# Altium footprint library TarabusLib_KAP.PcbLib: 504 footprints (part 14 of 32)
Each footprint in its own frame and in the unit in brackets; x right, y up, seen from the top. Pads: shape width x height; smd on the part's side, far side on the other; paste and mask are expansions set on the pad; w line width, h text height; cw(c..) or ccw(c..) is an arc to the next point about the centre after c.
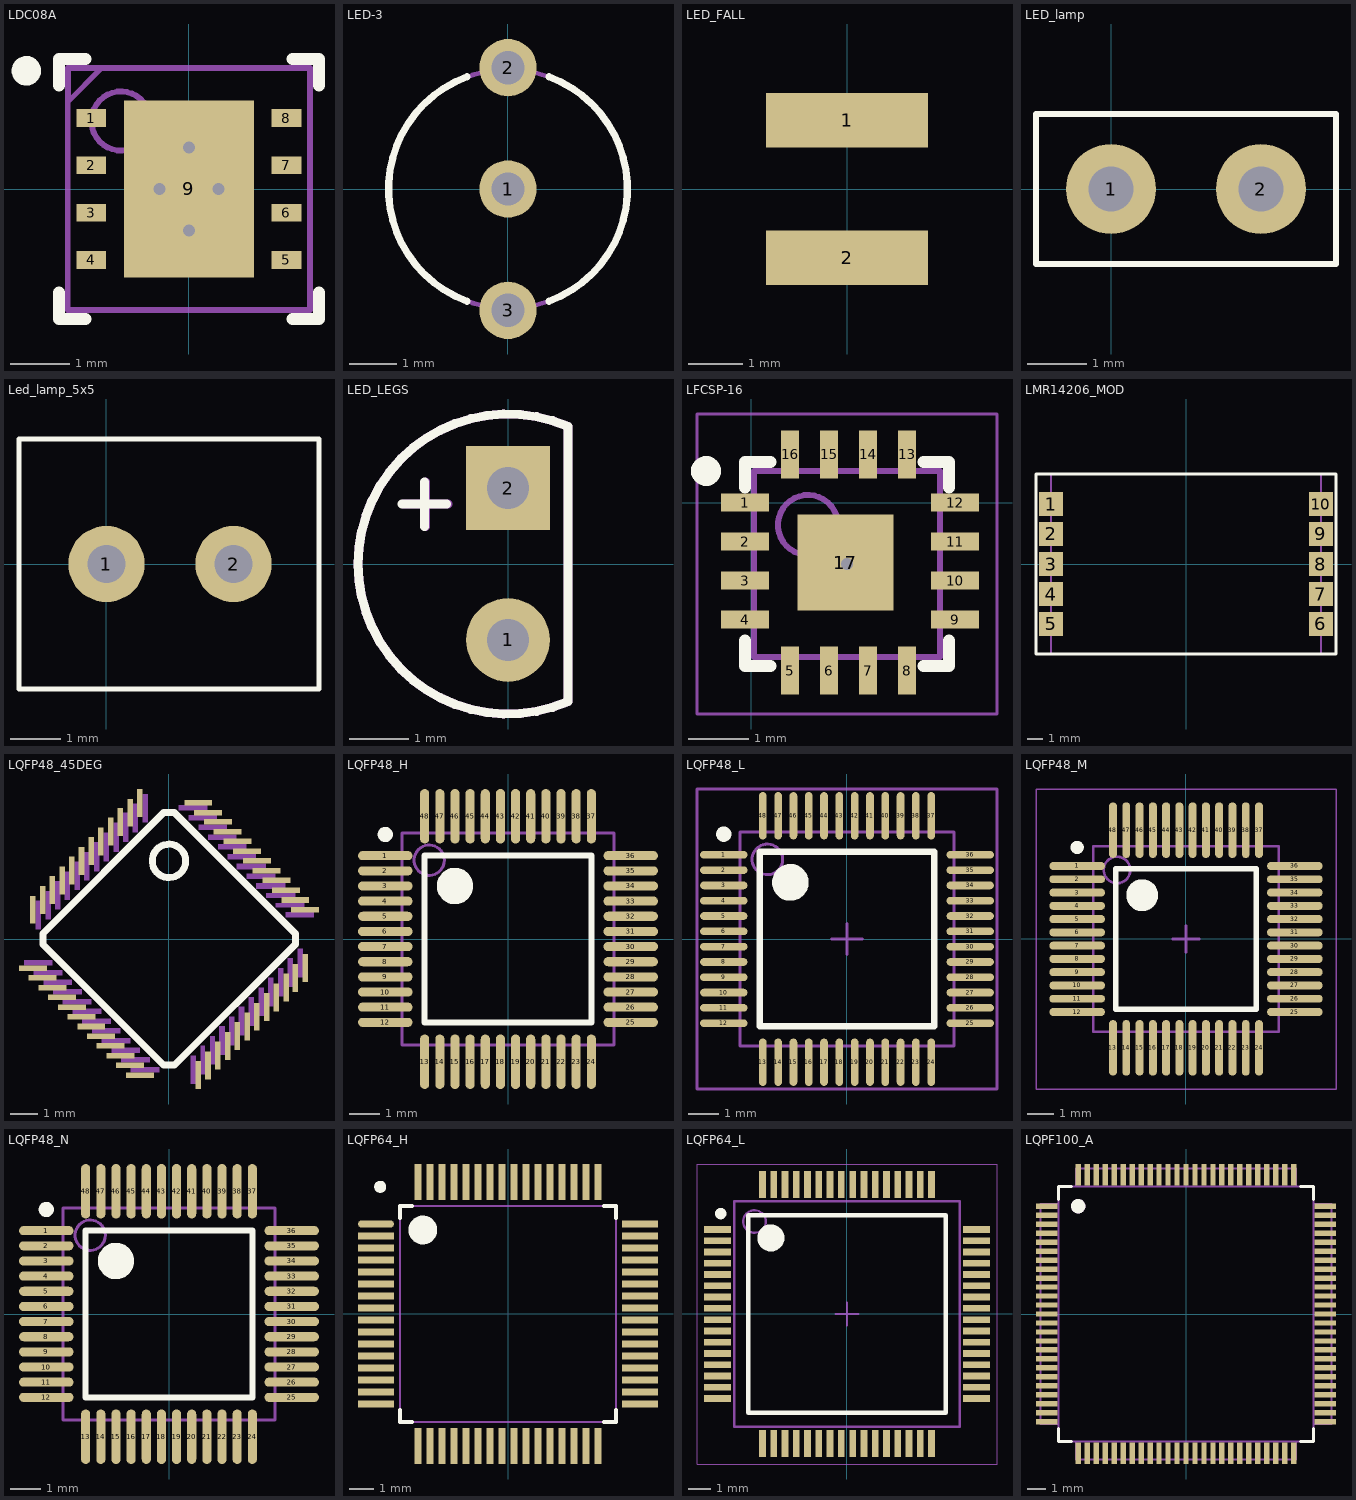
[diagram p13: the footprints below, top view; thin cyan lines are the x and y axes]

## LDC08A [mm] "PSON, 8-Leads, Body 4x4mm, Pitch 0.8mm, NSC Recommended"
height 0.8
pads (9):
  rect 0.5x0.3 smd mask+0.051: 1(-1.65,1.2) 2(-1.65,0.4) 3(-1.65,-0.4) 4(-1.65,-1.2) 5(1.65,-1.2) 6(1.65,-0.4) 7(1.65,0.4) 8(1.65,1.2)
  rect 2.2x3 smd paste-1.5 mask+0.051: 9(0,0)
via 0,-0.7 diameter 0.5 hole 0.2
via 0,0.7 diameter 0.5 hole 0.2
via 0.5,0 diameter 0.5 hole 0.2
via -0.5,0 diameter 0.5 hole 0.2
Top Overlay:
  circle w0.25: c-2.75,2 r0.125
  lines w0.2: -2.2,-1.75 -2.2,-2.2 -1.75,-2.2 ; -2.2,1.75 -2.2,2.2 -1.75,2.2 ; 1.75,-2.2 2.2,-2.2 2.2,-1.75 ; 1.75,2.2 2.2,2.2 2.2,1.75
Top Paste:
  region: 1,-0.15 0.15,-0.15 0.15,-1.4 1,-1.4
  rectangle: -1,-1.4 -0.15,-0.15
  rectangle: -1,0.15 -0.15,1.4
  region: 1,1.4 0.15,1.4 0.15,0.15 1,0.15
Mechanical 7:
  lines w0.05: -2.05,1.45 -1.45,2.05 ; -2.05,2.029 -1.494,2.029 ; -2.037,1.513 -1.525,2.025 ; -2.021,1.494 -2.021,2.05 ; -2.05,-2.05 -2.05,2.057 2.05,2.057 2.05,-2.05 -2.05,-2.05
  lines w0.1: -0.5,0 0.5,0 ; 0,-0.5 0,0.5
Mechanical 9:
  circle w0.1: c-1.15,1.15 r0.5
  lines w0.1: -2.05,-2.05 -2.05,2.05 2.05,2.05 2.05,-2.05 -2.05,-2.05
Mechanical 10:
  text ".Designator" at -0.9,-2.8 h0.6
  text ".Comment" at -0.9,2.5 h0.6
3D body: height 0.8, standoff 0, extent -2.05,-2.05 2.05,2.05

## LED-3 [mm]
pads (3):
  round 1.2 hole 0.7: 1(0,0) 2(0,2.54) 3(0,-2.54)
Top Overlay:
  lines w0.15: -0.855,-2.349 cw(c0,0) -0.855,2.349 ; 0.855,-2.349 ccw(c0,0) 0.855,2.349
Mechanical 7:
  circle w0.1: c0,0 r2.5
Mechanical 10:
  text ".Comment" at -0.5,-3.875 h0.6
  text ".Designator" at -0.625,3.575 h0.8

## LED_FALL [mm]
pads (2):
  rect 3x1 smd: 1(0,1.27) 2(0,-1.27)

## LED_lamp [mil] "Rectangular Type LED lamp"
pads (2):
  round 60 hole 30: 1(0,0) 2(100,0)
Top Overlay:
  lines w3.94: -50,-50 -50,50 150,50 150,-50 -50,-50
3D body "Rectangular Type LED lamp (зеленый).STEP": height 275.59, standoff -1000, extent -49.21,-53.15 147.64,53.15

## Led_lamp_5x5 [mil]
pads (2):
  round 60 hole 30: 1(0,0) 2(100,0)
Top Overlay:
  lines w3.94: -59.06,98.43 157.48,98.43 ; 167.32,78.74 167.32,-78.74 ; 157.48,98.43 -68.9,98.43 -68.9,78.74 -68.9,0 -68.9,-78.74 -68.9,-98.43 -59.06,-98.43 157.48,-98.43 167.32,-98.43 167.32,-78.74 ; 157.48,98.43 167.32,98.43 167.32,-78.74
3D body "5x5mm SQUARE TOP LED LAMP (красный).STEP": height 283.46, standoff -1062.99, extent -68.9,-98.43 167.32,98.43

## LED_LEGS [mm]
height 7.6
pads (2):
  round 1.4 hole 0.7: 1(0,-1.27)
  rect 1.4x1.4 hole 0.7: 2(0,1.27)
Top Overlay:
  lines w0.15: -1.775,1 -1.025,1 ; -1.4,0.625 -1.4,1.375 ; 1,-2.3 cw(c0,0) 1,2.3 1,-2.3
Mechanical 7:
  lines w0.15: -1.75,1 -1,1 ; -1.375,0.625 -1.375,1.375 ; 1,-2.3 cw(c0,0) 1,2.3 1,-2.3
Mechanical 10:
  text ".Designator" at 1,2.5 h0.8
  text ".Comment" at 0.25,-3.5 h0.6
3D body "ИК светодиод L-34SF4C.STEP": height 3.9, standoff 0.1, extent -0.099,-1.9 7.699,1.9

## LFCSP-16 [mm]
pads (17):
  rect 0.8x0.3 smd: 1(-0.1,0) 2(-0.1,-0.65) 3(-0.1,-1.3) 4(-0.1,-1.95) 9(3.4,-1.95) 10(3.4,-1.3) 11(3.4,-0.65) 12(3.4,0)
  rect 0.3x0.8 smd: 5(0.65,-2.8) 6(1.3,-2.8) 7(1.95,-2.8) 8(2.6,-2.8) 13(2.6,0.8) 14(1.95,0.8) 15(1.3,0.8) 16(0.65,0.8)
  rect 1.6x1.6 smd: 17(1.575,-1)
via 1.6,-1.025 diameter 0.5 hole 0.2
Top Overlay:
  circle w0.25: c-0.75,0.525 r0.125
  lines w0.2: -0.1,-2.3 -0.1,-2.725 0.325,-2.725 ; -0.1,0.25 -0.1,0.675 0.325,0.675 ; 2.875,-2.725 3.3,-2.725 3.3,-2.3 ; 2.875,0.675 3.3,0.675 3.3,0.25
Mechanical 13:
  circle w0.1: c0.95,-0.375 r0.5
  lines w0.1: 0.05,-2.575 0.05,0.525 3.15,0.525 3.15,-2.575 0.05,-2.575
Mechanical 15:
  lines w0.05: -0.9,-3.525 -0.9,1.475 4.1,1.475 4.1,-3.525 -0.9,-3.525
  lines w0.1: 1.1,-1.025 2.1,-1.025 ; 1.6,-1.525 1.6,-0.525
3D body "LFCSP16.STEP": height 1, standoff 0, extent -0.375,-2.975 3.625,1.025

## LMR14206_MOD [mm]
height 5
pads (10):
  rect 1.6x1.6 smd: 1(-9,4) 2(-9,2) 3(-9,0) 4(-9,-2) 5(-9,-4) 6(9,-4) 7(9,-2) 8(9,0) 9(9,2) 10(9,4)
Top Overlay:
  lines w0.2: -10,-6 10,-6 10,6 -10,6 -10,-6
Mechanical 7:
  lines w0.15: -9,-6 -9,6 9,6 9,-6 -9,-6
3D body "KPTV.E11.013.98.00.step": height 3.5, standoff 0.09, extent -9,-6 9,6

## LQFP48_45DEG [mil]
pads (48):
  rect 8x40 smd: 1(-41.76,195) 2(-55.68,181) 3(-69.59,168) 4(-83.52,154) 5(-97.43,140) 6(-111.35,126) 7(-125.27,112) 8(-139.19,98) 9(-153.11,84) 10(-167.03,70) 11(-180.95,56) 12(-194.87,42) 25(42,-194.87) 26(56,-180.95) 27(70,-167.03) 28(84,-153.11) 29(98,-139.19) 30(112,-125.27) 31(126,-111.35) 32(140,-97.43) 33(154,-83.52) 34(168,-69.59) 35(181,-55.68) 36(195,-41.76)
  rect 40x8 smd: 13(-194.87,-41.76) 14(-180.95,-55.68) 15(-167.03,-69.59) 16(-153.11,-83.52) 17(-139.19,-97.43) 18(-125.27,-111.35) 19(-111.35,-125.27) 20(-97.43,-139.19) 21(-83.52,-153.11) 22(-69.59,-167.03) 23(-55.68,-180.95) 24(-41.76,-194.87) 37(195,42) 38(181,56) 39(168,70) 40(154,84) 41(140,98) 42(126,112) 43(112,126) 44(98,140) 45(84,154) 46(70,168) 47(56,181) 48(42,195)
Top Overlay:
  circle w10: c0,112 r24
  lines w10: -180.26,-7.65 -180.26,8 -7.65,181 8,181 181,8 181,-7.65 8,-180.26 -7.65,-180.26 -180.26,-7.65
Mechanical 16:
  rectangle: 14,184 55,192
  rectangle: 28,170 69,178
  rectangle: 42,156 83,164
  rectangle: 56,142 97,150
  rectangle: 70,128 111,136
  rectangle: 84,114 125,122
  rectangle: 97,100 139,108
  rectangle: 111,86 153,94
  rectangle: 125,72 167,80
  rectangle: 139,59 181,66
  rectangle: 153,45 194,52
  rectangle: 167,31 208,39
  rectangle: 184,-54.77 192,-13.43
  rectangle: 170,-68.69 178,-27.35
  rectangle: 156,-82.61 164,-41.27
  rectangle: 142,-96.53 150,-55.19
  rectangle: 128,-110.45 136,-69.11
  rectangle: 114,-124.37 122,-83.03
  rectangle: 100,-138.29 108,-96.95
  rectangle: 86,-152.2 94,-110.87
  rectangle: 72,-166.13 80,-124.79
  rectangle: 59,-180.04 66,-138.7
  rectangle: 45,-193.96 52,-152.63
  rectangle: 31,-207.88 39,-166.54
  rectangle: -54.77,-191.15 -13.43,-183.28
  rectangle: -68.69,-177.23 -27.35,-169.36
  rectangle: -82.61,-163.31 -41.27,-155.44
  rectangle: -96.53,-149.39 -55.19,-141.52
  rectangle: -110.45,-135.47 -69.11,-127.6
  rectangle: -124.37,-121.56 -83.03,-113.68
  rectangle: -138.29,-107.63 -96.95,-99.76
  rectangle: -152.2,-93.72 -110.87,-85.84
  rectangle: -166.13,-79.8 -124.79,-71.92
  rectangle: -180.04,-65.88 -138.7,-58
  rectangle: -193.96,-51.96 -152.63,-44.08
  rectangle: -207.88,-38.04 -166.54,-30.17
  rectangle: -191.15,14 -183.28,55
  rectangle: -177.23,28 -169.36,69
  rectangle: -163.31,42 -155.44,83
  rectangle: -149.39,56 -141.52,97
  rectangle: -135.47,70 -127.6,111
  rectangle: -121.56,84 -113.68,125
  rectangle: -107.63,97 -99.76,139
  rectangle: -93.72,111 -85.84,153
  rectangle: -79.8,125 -71.92,167
  rectangle: -65.88,139 -58,181
  rectangle: -51.96,153 -44.08,194
  rectangle: -38.04,167 -30.17,208

## LQFP48_H [mm]
height 1.6
pads (48):
  oval 1.8x0.3 smd: 1(-4.05,2.75) 2(-4.05,2.25) 3(-4.05,1.75) 4(-4.05,1.25) 5(-4.05,0.75) 6(-4.05,0.25) 7(-4.05,-0.25) 8(-4.05,-0.75) 9(-4.05,-1.25) 10(-4.05,-1.75) 11(-4.05,-2.25) 12(-4.05,-2.75) 25(4.05,-2.75) 26(4.05,-2.25) 27(4.05,-1.75) 28(4.05,-1.25) 29(4.05,-0.75) 30(4.05,-0.25) 31(4.05,0.25) 32(4.05,0.75) 33(4.05,1.25) 34(4.05,1.75) 35(4.05,2.25) 36(4.05,2.75)
  oval 0.3x1.8 smd: 13(-2.75,-4.05) 14(-2.25,-4.05) 15(-1.75,-4.05) 16(-1.25,-4.05) 17(-0.75,-4.05) 18(-0.25,-4.05) 19(0.25,-4.05) 20(0.75,-4.05) 21(1.25,-4.05) 22(1.75,-4.05) 23(2.25,-4.05) 24(2.75,-4.05) 37(2.75,4.05) 38(2.25,4.05) 39(1.75,4.05) 40(1.25,4.05) 41(0.75,4.05) 42(0.25,4.05) 43(-0.25,4.05) 44(-0.75,4.05) 45(-1.25,4.05) 46(-1.75,4.05) 47(-2.25,4.05) 48(-2.75,4.05)
Top Overlay:
  circle w0.6: c-1.75,1.75 r0.3
  circle w0.25: c-4.05,3.45 r0.125
  lines w0.2: -2.75,-2.75 2.75,-2.75 2.75,2.75 -2.75,2.75 -2.75,-2.75
Mechanical 7:
  circle w0.1: c-2.6,2.6 r0.5
  lines w0.1: -3.5,-3.5 3.5,-3.5 3.5,3.5 -3.5,3.5 -3.5,-3.5
Mechanical 10:
  text ".Designator" at 1.9,5.4 h0.8
  text ".Comment" at -3.7,-5.6 h0.6
3D body "vbh48a.stp": height 1.46, standoff -0.04, extent -4.507,-4.507 4.508,4.508

## LQFP48_L [mm] "Thin QFP, 48-Leads, Body 7x7mm, Pitch 0.5mm, IPC High Density"
height 1.6
pads (48):
  oval 1.55x0.25 smd: 1(-4.025,2.75) 2(-4.025,2.25) 3(-4.025,1.75) 4(-4.025,1.25) 5(-4.025,0.75) 6(-4.025,0.25) 7(-4.025,-0.25) 8(-4.025,-0.75) 9(-4.025,-1.25) 10(-4.025,-1.75) 11(-4.025,-2.25) 12(-4.025,-2.75) 25(4.025,-2.75) 26(4.025,-2.25) 27(4.025,-1.75) 28(4.025,-1.25) 29(4.025,-0.75) 30(4.025,-0.25) 31(4.025,0.25) 32(4.025,0.75) 33(4.025,1.25) 34(4.025,1.75) 35(4.025,2.25) 36(4.025,2.75)
  oval 0.25x1.55 smd: 13(-2.75,-4.025) 14(-2.25,-4.025) 15(-1.75,-4.025) 16(-1.25,-4.025) 17(-0.75,-4.025) 18(-0.25,-4.025) 19(0.25,-4.025) 20(0.75,-4.025) 21(1.25,-4.025) 22(1.75,-4.025) 23(2.25,-4.025) 24(2.75,-4.025) 37(2.75,4.025) 38(2.25,4.025) 39(1.75,4.025) 40(1.25,4.025) 41(0.75,4.025) 42(0.25,4.025) 43(-0.25,4.025) 44(-0.75,4.025) 45(-1.25,4.025) 46(-1.75,4.025) 47(-2.25,4.025) 48(-2.75,4.025)
Top Overlay:
  circle w0.6: c-1.85,1.85 r0.3
  circle w0.25: c-4.025,3.425 r0.125
  lines w0.2: -2.85,-2.85 2.85,-2.85 2.85,2.85 -2.85,2.85 -2.85,-2.85
Mechanical 13:
  circle w0.1: c-2.6,2.6 r0.5
  lines w0.1: -3.5,-3.5 3.5,-3.5 3.5,3.5 -3.5,3.5 -3.5,-3.5
Mechanical 15:
  lines w0.1: -0.5,0 0.5,0 ; 0,-0.5 0,0.5 ; -4.9,-4.9 4.9,-4.9 4.9,4.9 -4.9,4.9 -4.9,-4.9
3D body: height 1.6, standoff 0, extent -3.5,-3.5 3.5,3.5

## LQFP48_M [mm] "QFP, 48-Leads, Body 7x7mm, Pitch 0.5mm, IPC Low Density"
height 1.6
pads (48):
  oval 2.1x0.3 smd: 1(-4.1,2.75) 2(-4.1,2.25) 3(-4.1,1.75) 4(-4.1,1.25) 5(-4.1,0.75) 6(-4.1,0.25) 7(-4.1,-0.25) 8(-4.1,-0.75) 9(-4.1,-1.25) 10(-4.1,-1.75) 11(-4.1,-2.25) 12(-4.1,-2.75) 25(4.1,-2.75) 26(4.1,-2.25) 27(4.1,-1.75) 28(4.1,-1.25) 29(4.1,-0.75) 30(4.1,-0.25) 31(4.1,0.25) 32(4.1,0.75) 33(4.1,1.25) 34(4.1,1.75) 35(4.1,2.25) 36(4.1,2.75)
  oval 0.3x2.1 smd: 13(-2.75,-4.1) 14(-2.25,-4.1) 15(-1.75,-4.1) 16(-1.25,-4.1) 17(-0.75,-4.1) 18(-0.25,-4.1) 19(0.25,-4.1) 20(0.75,-4.1) 21(1.25,-4.1) 22(1.75,-4.1) 23(2.25,-4.1) 24(2.75,-4.1) 37(2.75,4.1) 38(2.25,4.1) 39(1.75,4.1) 40(1.25,4.1) 41(0.75,4.1) 42(0.25,4.1) 43(-0.25,4.1) 44(-0.75,4.1) 45(-1.25,4.1) 46(-1.75,4.1) 47(-2.25,4.1) 48(-2.75,4.1)
Top Overlay:
  circle w0.25: c-4.1,3.45 r0.125
  circle w0.6: c-1.65,1.65 r0.3
  lines w0.2: -2.65,-2.65 -2.65,2.65 2.65,2.65 2.65,-2.65 -2.65,-2.65
Mechanical 13:
  circle w0.1: c-2.6,2.6 r0.5
  lines w0.1: -3.5,-3.5 -3.5,3.5 3.5,3.5 3.5,-3.5 -3.5,-3.5
Mechanical 15:
  lines w0.05: -5.65,-5.65 -5.65,5.65 5.65,5.65 5.65,-5.65 -5.65,-5.65
  lines w0.1: -0.5,0 0.5,0 ; 0,-0.5 0,0.5
3D body: height 1.6, standoff 0.05, extent -3.5,-3.5 3.5,3.5

## LQFP48_N [mm] "Thin QFP, 48-Leads, Body 7x7mm, Pitch 0.5mm, IPC Medium Density"
height 1.6
pads (48):
  oval 1.8x0.3 smd: 1(-4.05,2.75) 2(-4.05,2.25) 3(-4.05,1.75) 4(-4.05,1.25) 5(-4.05,0.75) 6(-4.05,0.25) 7(-4.05,-0.25) 8(-4.05,-0.75) 9(-4.05,-1.25) 10(-4.05,-1.75) 11(-4.05,-2.25) 12(-4.05,-2.75) 25(4.05,-2.75) 26(4.05,-2.25) 27(4.05,-1.75) 28(4.05,-1.25) 29(4.05,-0.75) 30(4.05,-0.25) 31(4.05,0.25) 32(4.05,0.75) 33(4.05,1.25) 34(4.05,1.75) 35(4.05,2.25) 36(4.05,2.75)
  oval 0.3x1.8 smd: 13(-2.75,-4.05) 14(-2.25,-4.05) 15(-1.75,-4.05) 16(-1.25,-4.05) 17(-0.75,-4.05) 18(-0.25,-4.05) 19(0.25,-4.05) 20(0.75,-4.05) 21(1.25,-4.05) 22(1.75,-4.05) 23(2.25,-4.05) 24(2.75,-4.05) 37(2.75,4.05) 38(2.25,4.05) 39(1.75,4.05) 40(1.25,4.05) 41(0.75,4.05) 42(0.25,4.05) 43(-0.25,4.05) 44(-0.75,4.05) 45(-1.25,4.05) 46(-1.75,4.05) 47(-2.25,4.05) 48(-2.75,4.05)
Top Overlay:
  circle w0.6: c-1.75,1.75 r0.3
  circle w0.25: c-4.05,3.45 r0.125
  lines w0.2: -2.75,-2.75 2.75,-2.75 2.75,2.75 -2.75,2.75 -2.75,-2.75
Mechanical 7:
  circle w0.1: c-2.6,2.6 r0.5
  lines w0.1: -3.5,-3.5 3.5,-3.5 3.5,3.5 -3.5,3.5 -3.5,-3.5
Mechanical 10:
  text ".Designator" at 1.9,5.4 h0.8
  text ".Comment" at -3.7,-5.6 h0.6
3D body "vbh48a.stp": height 1.46, standoff -0.04, extent -4.507,-4.507 4.508,4.508

## LQFP64_H [mm] "64-Pin Low Profile Quad Pack 0.5 mm Pitch, IPC High Density"
height 1.6
pads (64):
  oval 1.5x0.3 smd mask+0.05: 1(-5.5,3.75)
  rect 1.5x0.3 smd mask+0.05: 2(-5.5,3.25) 3(-5.5,2.75) 4(-5.5,2.25) 5(-5.5,1.75) 6(-5.5,1.25) 7(-5.5,0.75) 8(-5.5,0.25) 9(-5.5,-0.25) 10(-5.5,-0.75) 11(-5.5,-1.25) 12(-5.5,-1.75) 13(-5.5,-2.25) 14(-5.5,-2.75) 15(-5.5,-3.25) 16(-5.5,-3.75) 33(5.5,-3.75) 34(5.5,-3.25) 35(5.5,-2.75) 36(5.5,-2.25) 37(5.5,-1.75) 38(5.5,-1.25) 39(5.5,-0.75) 40(5.5,-0.25) 41(5.5,0.25) 42(5.5,0.75) 43(5.5,1.25) 44(5.5,1.75) 45(5.5,2.25) 46(5.5,2.75) 47(5.5,3.25) 48(5.5,3.75)
  rect 0.3x1.5 smd mask+0.05: 17(-3.75,-5.5) 18(-3.25,-5.5) 19(-2.75,-5.5) 20(-2.25,-5.5) 21(-1.75,-5.5) 22(-1.25,-5.5) 23(-0.75,-5.5) 24(-0.25,-5.5) 25(0.25,-5.5) 26(0.75,-5.5) 27(1.25,-5.5) 28(1.75,-5.5) 29(2.25,-5.5) 30(2.75,-5.5) 31(3.25,-5.5) 32(3.75,-5.5) 49(3.75,5.5) 50(3.25,5.5) 51(2.75,5.5) 52(2.25,5.5) 53(1.75,5.5) 54(1.25,5.5) 55(0.75,5.5) 56(0.25,5.5) 57(-0.25,5.5) 58(-0.75,5.5) 59(-1.25,5.5) 60(-1.75,5.5) 61(-2.25,5.5) 62(-2.75,5.5) 63(-3.25,5.5) 64(-3.75,5.5)
Top Overlay:
  circle w0.6: c-3.55,3.5 r0.3
  circle w0.25: c-5.325,5.3 r0.125
  lines w0.15: -4.5,-4 -4.5,-4.5 -4,-4.5 ; -4.5,4 -4.5,4.5 -4,4.5 ; 4,-4.5 4.5,-4.5 4.5,-4 ; 4,4.5 4.5,4.5 4.5,4
Mechanical 7:
  lines w0.1: -4.5,-4.5 4.5,-4.5 4.5,4.5 -4.5,4.5 -4.5,-4.5
3D body "User Library-lqpf64.step": height 1.5, standoff 0.02, extent -6,-6 6,6

## LQFP64_L [mm] "TSQFP, 64-Leads, Body 10,00x10,00mm, Pitch 0,50mm, IPC Medium Density"
height 1.6
pads (64):
  rect 1.2x0.3 smd: 1(-5.75,3.75) 2(-5.75,3.25) 3(-5.75,2.75) 4(-5.75,2.25) 5(-5.75,1.75) 6(-5.75,1.25) 7(-5.75,0.75) 8(-5.75,0.25) 9(-5.75,-0.25) 10(-5.75,-0.75) 11(-5.75,-1.25) 12(-5.75,-1.75) 13(-5.75,-2.25) 14(-5.75,-2.75) 15(-5.75,-3.25) 16(-5.75,-3.75) 33(5.75,-3.75) 34(5.75,-3.25) 35(5.75,-2.75) 36(5.75,-2.25) 37(5.75,-1.75) 38(5.75,-1.25) 39(5.75,-0.75) 40(5.75,-0.25) 41(5.75,0.25) 42(5.75,0.75) 43(5.75,1.25) 44(5.75,1.75) 45(5.75,2.25) 46(5.75,2.75) 47(5.75,3.25) 48(5.75,3.75)
  rect 0.3x1.2 smd: 17(-3.75,-5.75) 18(-3.25,-5.75) 19(-2.75,-5.75) 20(-2.25,-5.75) 21(-1.75,-5.75) 22(-1.25,-5.75) 23(-0.75,-5.75) 24(-0.25,-5.75) 25(0.25,-5.75) 26(0.75,-5.75) 27(1.25,-5.75) 28(1.75,-5.75) 29(2.25,-5.75) 30(2.75,-5.75) 31(3.25,-5.75) 32(3.75,-5.75) 49(3.75,5.75) 50(3.25,5.75) 51(2.75,5.75) 52(2.25,5.75) 53(1.75,5.75) 54(1.25,5.75) 55(0.75,5.75) 56(0.25,5.75) 57(-0.25,5.75) 58(-0.75,5.75) 59(-1.25,5.75) 60(-1.75,5.75) 61(-2.25,5.75) 62(-2.75,5.75) 63(-3.25,5.75) 64(-3.75,5.75)
Top Overlay:
  circle w0.6: c-3.375,3.375 r0.3
  circle w0.25: c-5.6,4.45 r0.125
  lines w0.2: -4.375,-4.375 4.375,-4.375 4.375,4.375 -4.375,4.375 -4.375,-4.375
Mechanical 7:
  circle w0.1: c-4.1,4.1 r0.5
  lines w0.1: -5,-5 5,-5 5,5 -5,5 -5,-5
Mechanical 15:
  lines w0.05: -6.65,-6.65 6.65,-6.65 6.65,6.65 -6.65,6.65 -6.65,-6.65
  lines w0.1: -0.5,0 0.5,0 ; 0,-0.5 0,0.5
3D body "LQFP64-0_5.STEP": height 1.55, standoff -0.02, extent -5.886,-5.886 5.886,5.886

## LQPF100_A [mm]
height 1.6
pads (100):
  rect 1.2x0.3 smd: 1(-7.75,6) 2(-7.75,5.5) 3(-7.75,5) 4(-7.75,4.5) 5(-7.75,4) 6(-7.75,3.5) 7(-7.75,3) 8(-7.75,2.5) 9(-7.75,2) 10(-7.75,1.5) 11(-7.75,1) 12(-7.75,0.5) 13(-7.75,0) 14(-7.75,-0.5) 15(-7.75,-1) 16(-7.75,-1.5) 17(-7.75,-2) 18(-7.75,-2.5) 19(-7.75,-3) 20(-7.75,-3.5) 21(-7.75,-4) 22(-7.75,-4.5) 23(-7.75,-5) 24(-7.75,-5.5) 25(-7.75,-6) 51(7.75,-6) 52(7.75,-5.5) 53(7.75,-5) 54(7.75,-4.5) 55(7.75,-4) 56(7.75,-3.5) 57(7.75,-3) 58(7.75,-2.5) 59(7.75,-2) 60(7.75,-1.5) 61(7.75,-1) 62(7.75,-0.5) 63(7.75,0) 64(7.75,0.5) 65(7.75,1) 66(7.75,1.5) 67(7.75,2) 68(7.75,2.5) 69(7.75,3) 70(7.75,3.5) 71(7.75,4) 72(7.75,4.5) 73(7.75,5) 74(7.75,5.5) 75(7.75,6)
  rect 0.3x1.2 smd: 26(-6,-7.75) 27(-5.5,-7.75) 28(-5,-7.75) 29(-4.5,-7.75) 30(-4,-7.75) 31(-3.5,-7.75) 32(-3,-7.75) 33(-2.5,-7.75) 34(-2,-7.75) 35(-1.5,-7.75) 36(-1,-7.75) 37(-0.5,-7.75) 38(0,-7.75) 39(0.5,-7.75) 40(1,-7.75) 41(1.5,-7.75) 42(2,-7.75) 43(2.5,-7.75) 44(3,-7.75) 45(3.5,-7.75) 46(4,-7.75) 47(4.5,-7.75) 48(5,-7.75) 49(5.5,-7.75) 50(6,-7.75) 76(6,7.75) 77(5.5,7.75) 78(5,7.75) 79(4.5,7.75) 80(4,7.75) 81(3.5,7.75) 82(3,7.75) 83(2.5,7.75) 84(2,7.75) 85(1.5,7.75) 86(1,7.75) 87(0.5,7.75) 88(0,7.75) 89(-0.5,7.75) 90(-1,7.75) 91(-1.5,7.75) 92(-2,7.75) 93(-2.5,7.75) 94(-3,7.75) 95(-3.5,7.75) 96(-4,7.75) 97(-4.5,7.75) 98(-5,7.75) 99(-5.5,7.75) 100(-6,7.75)
Top Overlay:
  circle w0.4: c-6,6 r0.2
  lines w0.15: -7.1,-6.375 -7.1,-7.1 -6.375,-7.1 ; -7.1,6.375 -7.1,7.1 -6.375,7.1 ; 6.375,-7.1 7.1,-7.1 7.1,-6.375 ; 6.375,7.1 7.1,7.1 7.1,6.375
Mechanical 7:
  circle w0.4: c-6,6 r0.2
  lines w0.1: -7.1,-6.135 -8.1,-6.135 -8.1,6.135 -7.1,6.135 ; -6.135,-7.1 -6.135,-8.1 6.135,-8.1 6.135,-7.1 ; -6.135,7.1 -6.135,8.1 6.135,8.1 6.135,7.1 ; 7.1,-6.135 8.1,-6.135 8.1,6.135 7.1,6.135 ; -7.1,-7.1 7.1,-7.1 7.1,7.1 -7.1,7.1 -7.1,-7.1
Mechanical 10:
  text ".Designator" at -1.2,0.155 h0.8
  text ".Comment" at -1.08,-0.495 h0.6
3D body: height 0.9, standoff 0, extent -6.135,-8.1 6.135,-7.1
3D body: height 0.9, standoff 0, extent 7.1,-6.135 8.1,6.135
3D body: height 0.9, standoff 0, extent -8.1,-6.135 -7.1,6.135
3D body: height 0.9, standoff 0, extent -6.135,7.1 6.135,8.1
3D body: height 1.6, standoff 0, extent -7.1,-7.1 7.1,7.1